# Altium footprint library Espressif.PcbLib: 20 footprints (part 1 of 2)
Each footprint in its own frame and in the unit in brackets; x right, y up, seen from the top. Pads: shape width x height; smd on the part's side, far side on the other; paste and mask are expansions set on the pad; w line width, h text height; cw(c..) or ccw(c..) is an arc to the next point about the centre after c.
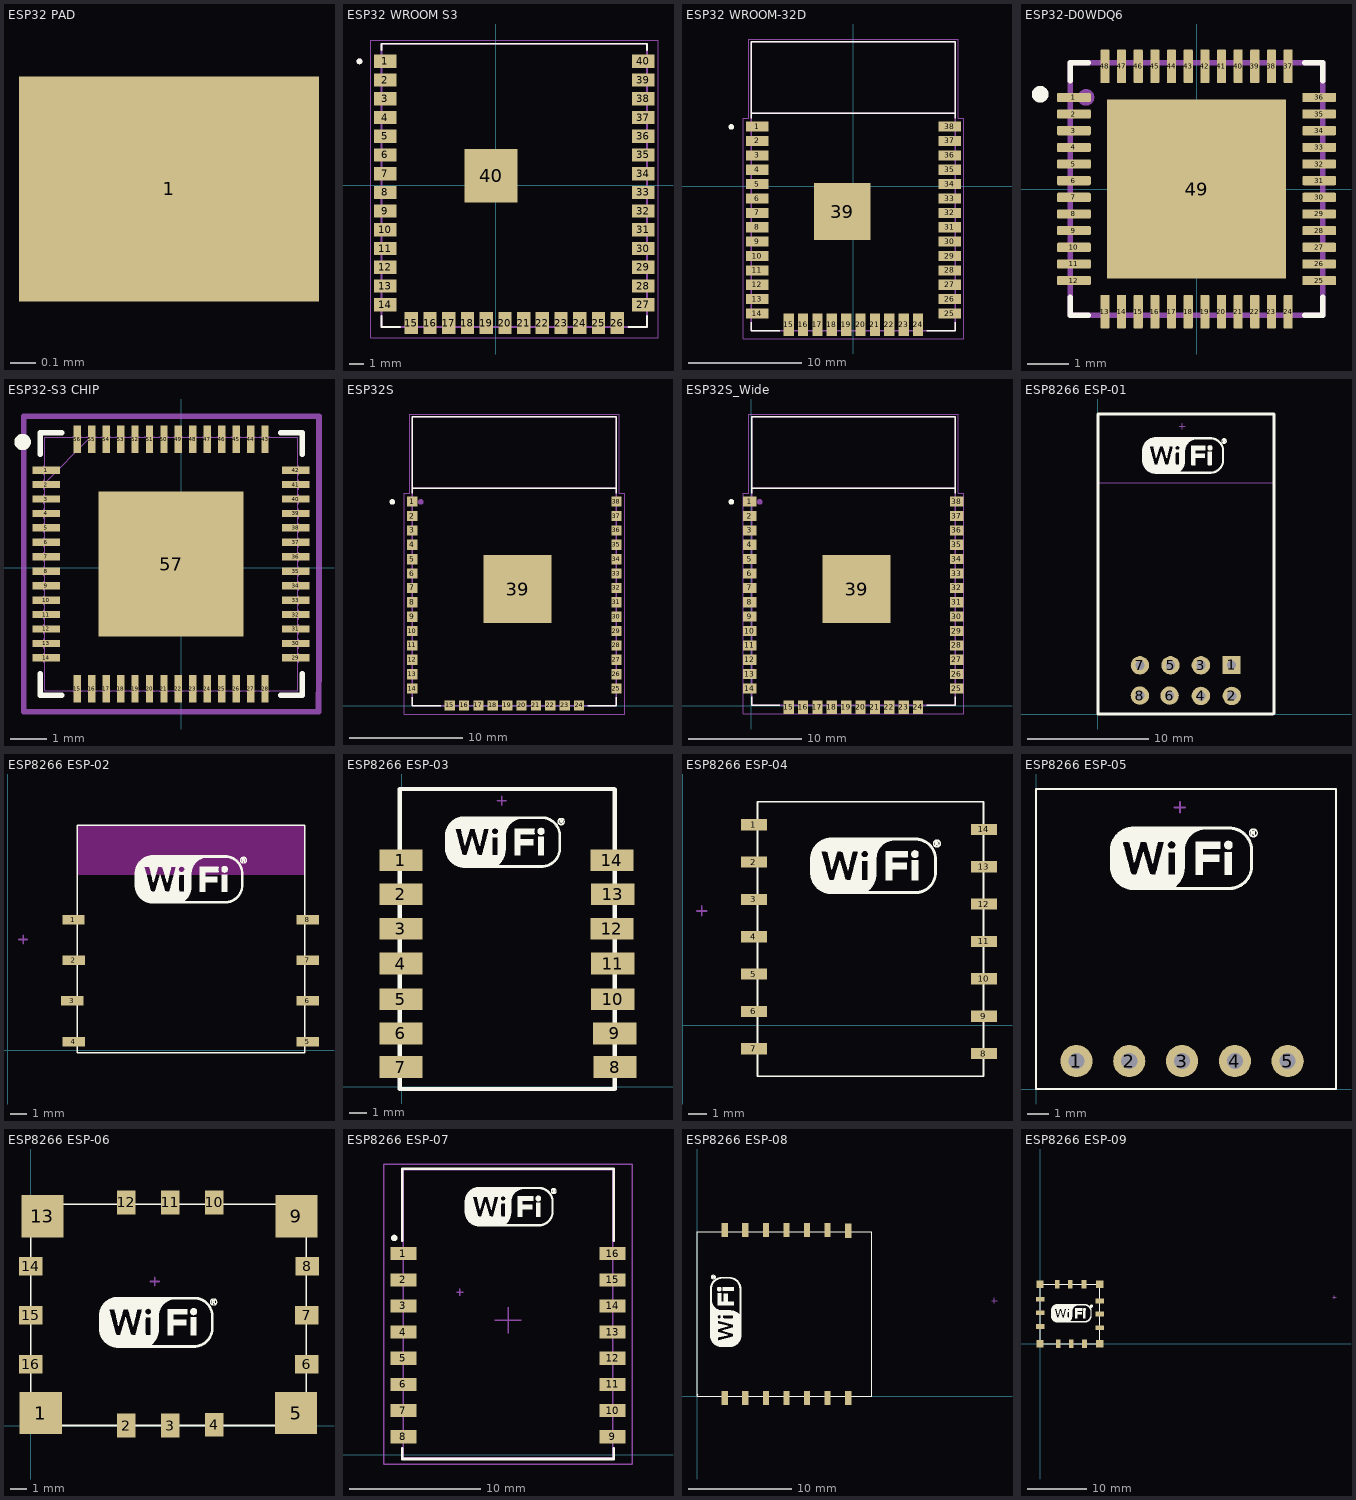
[diagram p0: the footprints below, top view; thin cyan lines are the x and y axes]

## ESP32 PAD [mm]
pads (1):
  rect 1.2x0.9 smd: 1(159.279,-33.319)

## ESP32 WROOM S3 [mm]
pads (41):
  rect 1.5x0.9 smd: 1(-7.507,8.395) 2(-7.507,7.125) 3(-7.507,5.855) 4(-7.507,4.585) 5(-7.507,3.315) 6(-7.507,2.045) 7(-7.507,0.775) 8(-7.507,-0.495) 9(-7.507,-1.765) 10(-7.507,-3.035) 11(-7.507,-4.305) 12(-7.507,-5.575) 13(-7.507,-6.845) 14(-7.507,-8.115) 27(9.993,-8.115) 28(9.993,-6.845) 29(9.993,-5.575) 30(9.993,-4.305) 31(9.993,-3.035) 32(9.993,-1.765) 33(9.993,-0.495) 34(9.993,0.775) 35(9.993,2.045) 36(9.993,3.315) 37(9.993,4.585) 38(9.993,5.855) 39(9.993,7.125) 40(9.993,8.395)
  rect 0.9x1.5 smd: 15(-5.742,-9.365) 16(-4.472,-9.365) 17(-3.202,-9.365) 18(-1.932,-9.365) 19(-0.662,-9.365) 20(0.608,-9.365) 21(1.878,-9.365) 22(3.148,-9.365) 23(4.418,-9.365) 24(5.688,-9.365) 25(6.958,-9.365) 26(8.228,-9.365)
  rect 3.6x3.6 smd: 40(-0.33,0.635)
Top Overlay:
  circle w0.2: c-9.257,8.395 r0.1
  lines w0.127: -7.757,-8.885 -7.757,-9.615 -6.512,-9.615 ; -7.757,9.165 -7.757,9.585 10.243,9.585 10.243,9.165 ; 8.998,-9.615 10.243,-9.615 10.243,-8.885
Mechanical 13:
  circle w0.2: c-9.257,8.395 r0.1
  lines w0.127: -7.757,-9.615 10.243,-9.615 10.243,9.585 -7.757,9.585 -7.757,-9.615
Mechanical 15:
  lines w0.05: -8.507,-10.365 -8.507,9.835 10.993,9.835 10.993,-10.365 -8.507,-10.365
3D body "ESP32-S3-WROOM-1U--3DModel-STEP-56544.STEP": height 3.35, standoff 0, extent -7.806,-9.549 10.194,9.651

## ESP32 WROOM-32D [mm]
pads (39):
  rect 2x0.9 smd: 1(-8.5,5.26) 2(-8.5,3.99) 3(-8.5,2.72) 4(-8.5,1.45) 5(-8.5,0.18) 6(-8.5,-1.09) 7(-8.5,-2.36) 8(-8.5,-3.63) 9(-8.5,-4.9) 10(-8.5,-6.17) 11(-8.5,-7.44) 12(-8.5,-8.71) 13(-8.5,-9.98) 14(-8.5,-11.25) 25(8.5,-11.25) 26(8.5,-9.98) 27(8.5,-8.71) 28(8.5,-7.44) 29(8.5,-6.17) 30(8.5,-4.9) 31(8.5,-3.63) 32(8.5,-2.36) 33(8.5,-1.09) 34(8.5,0.18) 35(8.5,1.45) 36(8.5,2.72) 37(8.5,3.99) 38(8.5,5.26)
  rect 0.9x2 smd: 15(-5.715,-12.25) 16(-4.445,-12.25) 17(-3.175,-12.25) 18(-1.905,-12.25) 19(-0.635,-12.25) 20(0.635,-12.25) 21(1.905,-12.25) 22(3.175,-12.25) 23(4.445,-12.25) 24(5.715,-12.25)
  rect 5x5 smd: 39(-1,-2.24)
Top Overlay:
  circle w0.3: c-10.777,5.238 r0.1
  lines w0.127: -9,-12 -9,-12.75 -6.5,-12.75 ; -9,6 -9,12.75 9,12.75 9,6 ; -8.96,6.45 8.96,6.45 ; 6.5,-12.75 9,-12.75 9,-12
Top Paste:
  region: -2.584,-0.659 0.581,-0.659 0.581,-3.825 -2.584,-3.825
Mechanical 4:
  circle w0.3: c-8.277,5.238 r0.1
  circle w0.3: c-8.277,5.238 r0.1
  lines w0.127: -9,-12.75 9,-12.75 ; -9,-12.75 -9,12.75 ; -9,-12.75 9,-12.75 ; -9,-12.75 -9,12.75 ; -9,12.75 9,12.75 ; -9,12.75 9,12.75 ; 9,-12.75 9,12.75 ; 9,-12.75 9,12.75 ; -8.96,6.45 8.96,6.45 -8.96,6.45
  text "ANTENNA" at -5.725,8.401 h1.88
  text "ANTENNA" at -5.725,8.401 h1.88
Mechanical 16:
  lines w0.05: -9.75,-13.5 9.75,-13.5 9.75,6 9.25,6 9.25,13 -9.25,13 -9.25,6 -9.75,6 -9.75,-13.5
3D body "ESP32 - WROOM - 32 v2-Altium.step": height 2.84, standoff -0.02, extent -9.008,-12.757 8.992,12.743

## ESP32-D0WDQ6 [mm]
pads (49):
  rrect25% 0.81x0.22 smd: 1(-2.945,2.2) 2(-2.945,1.8) 3(-2.945,1.4) 4(-2.945,1) 5(-2.945,0.6) 6(-2.945,0.2) 7(-2.945,-0.2) 8(-2.945,-0.6) 9(-2.945,-1) 10(-2.945,-1.4) 11(-2.945,-1.8) 12(-2.945,-2.2) 25(2.945,-2.2) 26(2.945,-1.8) 27(2.945,-1.4) 28(2.945,-1) 29(2.945,-0.6) 30(2.945,-0.2) 31(2.945,0.2) 32(2.945,0.6) 33(2.945,1) 34(2.945,1.4) 35(2.945,1.8) 36(2.945,2.2)
  rrect25% 0.22x0.81 smd: 13(-2.2,-2.945) 14(-1.8,-2.945) 15(-1.4,-2.945) 16(-1,-2.945) 17(-0.6,-2.945) 18(-0.2,-2.945) 19(0.2,-2.945) 20(0.6,-2.945) 21(1,-2.945) 22(1.4,-2.945) 23(1.8,-2.945) 24(2.2,-2.945) 37(2.2,2.945) 38(1.8,2.945) 39(1.4,2.945) 40(1,2.945) 41(0.6,2.945) 42(0.2,2.945) 43(-0.2,2.945) 44(-0.6,2.945) 45(-1,2.945) 46(-1.4,2.945) 47(-1.8,2.945) 48(-2.2,2.945)
  rect 4.3x4.3 smd paste-3: 49(0,0)
Top Overlay:
  circle w0.2: c-3.755,2.275 r0.1
  lines w0.127: -3.03,-2.6 -3.03,-3.03 -2.6,-3.03 ; -3.03,2.6 -3.03,3.03 -2.6,3.03 ; 2.6,-3.03 3.03,-3.03 3.03,-2.6 ; 2.6,3.03 3.03,3.03 3.03,2.6
Top Paste:
  region: 1.36,-1.362 -1.362,-1.362 -1.362,1.36 1.36,1.36
Mechanical 13:
  circle w0.2: c-2.655,2.2 r0.1
  lines w0.127: -3.03,-3.03 -3.03,3.03 3.03,3.03 3.03,-3.03 -3.03,-3.03
3D body "ESP32-D0WDQ6--3DModel-STEP-56544.STEP": height 0.85, standoff -0.05, extent -3,-3 3,3

## ESP32-S3 CHIP [mil]
pads (57):
  rect 30x8 smd paste+0 mask+0: 1(-147,106.36) 2(-147,90.61) 3(-147,74.87) 4(-147,59.12) 5(-147,43.37) 6(-147,27.62) 7(-147,11.87) 8(-147,-3.87) 9(-147,-19.62) 10(-147,-35.37) 11(-147,-51.12) 12(-147,-66.87) 13(-147,-82.61) 14(-147,-98.36) 29(125,-98.36) 30(125,-82.61) 31(125,-66.87) 32(125,-51.12) 33(125,-35.37) 34(125,-19.62) 35(125,-3.87) 36(125,11.87) 37(125,27.62) 38(125,43.37) 39(125,59.12) 40(125,74.87) 41(125,90.61) 42(125,106.36)
  rect 8x30 smd paste+0 mask+0: 15(-113.36,-132) 16(-97.61,-132) 17(-81.87,-132) 18(-66.12,-132) 19(-50.37,-132) 20(-34.62,-132) 21(-18.87,-132) 22(-3.13,-132) 23(12.62,-132) 24(28.37,-132) 25(44.12,-132) 26(59.87,-132) 27(75.61,-132) 28(91.36,-132) 43(91.36,140) 44(75.61,140) 45(59.87,140) 46(44.12,140) 47(28.37,140) 48(12.62,140) 49(-3.13,140) 50(-18.87,140) 51(-34.62,140) 52(-50.37,140) 53(-66.12,140) 54(-81.87,140) 55(-97.61,140) 56(-113.36,140)
  rect 158x158 smd paste-78.5 mask+0: 57(-11,4)
Top Overlay:
  circle w10: c-173,137 r3.94
  lines w6: -154,-115.46 -154,-139 -130.46,-139 ; -154,123.46 -154,147 -130.46,147 ; 108.46,-139 132,-139 132,-115.46 ; 108.46,147 132,147 132,123.46
Top Paste:
  region: -41.27,79.06 -86.06,79.06 -86.06,34.27 -41.27,34.27
  region: -41.27,26.4 -86.06,26.4 -86.06,-18.4 -41.27,-18.4
  region: -41.27,-26.27 -86.06,-26.27 -86.06,-71.06 -41.27,-71.06
  region: 11.4,79.06 -33.4,79.06 -33.4,34.27 11.4,34.27
  region: 11.4,26.4 -33.4,26.4 -33.4,-18.4 11.4,-18.4
  region: 11.4,-26.27 -33.4,-26.27 -33.4,-71.06 11.4,-71.06
  region: 64.06,79.06 19.27,79.06 19.27,34.27 64.06,34.27
  region: 64.06,26.4 19.27,26.4 19.27,-18.4 64.06,-18.4
  region: 64.06,-26.27 19.27,-26.27 19.27,-71.06 64.06,-71.06
Mechanical 1:
  lines w6: -172,-157 149.49,-157 150.2,-113.88 150.2,165 -156,165 -172,165 -172,-157
Mechanical 13:
  drawing of 229 lines, arcs and shapes, not listed
Mechanical 15:
  lines w6: -172,-157 -172,-112.36 -172,120.36 -172,146 -172,165 150,165 150,152 150,-112.36 150,-157 137,-157 -127.36,-157 -172,-157
3D body "QFN56_ESP32_7X7_EXP.step": height 35.12, standoff 0, extent -150.02,-135.02 128.02,143.02

## ESP32S [mm] "ESP32S-Module"
height 2.8
pads (39):
  rect 0.9x0.9 smd: 1(22.301,18.034) 2(22.301,16.764) 3(22.301,15.494) 4(22.301,14.224) 5(22.301,12.954) 6(22.301,11.684) 7(22.301,10.414) 8(22.301,9.144) 9(22.301,7.874) 10(22.301,6.604) 11(22.301,5.334) 12(22.301,4.064) 13(22.301,2.794) 14(22.301,1.524) 15(25.601,0.034) 16(26.871,0.034) 17(28.141,0.034) 18(29.411,0.034) 19(30.681,0.034) 20(31.951,0.034) 21(33.221,0.034) 22(34.491,0.034) 23(35.761,0.034) 24(37.031,0.034) 25(40.335,1.524) 26(40.335,2.794) 27(40.335,4.064) 28(40.335,5.334) 29(40.335,6.604) 30(40.335,7.874) 31(40.335,9.144) 32(40.335,10.414) 33(40.335,11.684) 34(40.335,12.954) 35(40.335,14.224) 36(40.335,15.494) 37(40.335,16.764) 38(40.335,18.034)
  rect 6x6 smd: 39(31.601,10.3)
Top Overlay:
  circle w0.3: c20.541,18.014 r0.1
  lines w0.127: 22.318,0.776 22.318,0.026 24.818,0.026 ; 22.318,18.776 22.318,25.526 40.318,25.526 40.318,18.776 ; 22.358,19.226 40.278,19.226 ; 37.818,0.026 40.318,0.026 40.318,0.776
Top Paste:
  region: 28.735,12.117 31.899,12.117 31.899,8.951 28.735,8.951
Mechanical 4:
  circle w0.3: c23.041,18.014 r0.1
  circle w0.3: c23.041,18.014 r0.1
  lines w0.127: 22.318,0.026 22.318,25.526 ; 22.318,0.026 22.318,25.526 ; 22.318,0.026 40.318,0.026 ; 22.318,0.026 40.318,0.026 ; 22.318,25.526 40.318,25.526 ; 22.318,25.526 40.318,25.526 ; 40.318,0.026 40.318,25.526 ; 40.318,0.026 40.318,25.526 ; 22.358,19.226 40.278,19.226 22.358,19.226
  text "ANTENNA" at 25.593,21.177 h1.88
  text "ANTENNA" at 25.593,21.177 h1.88
Mechanical 16:
  lines w0.05: 21.568,-0.724 21.568,18.776 22.068,18.776 22.068,25.776 40.568,25.776 40.568,18.776 41.068,18.776 41.068,-0.724 21.568,-0.724
3D body "ESP32 - WROOM - 32 v2-Altium.step": height 2.84, standoff -0.02, extent 22.311,0.019 40.311,25.519

## ESP32S_Wide [mm] "Esp32S Module wide for hand soldering"
pads (39):
  rect 1.2x0.9 smd: 1(-0.127,18.034) 2(-0.127,16.764) 3(-0.127,15.494) 4(-0.127,14.224) 5(-0.127,12.954) 6(-0.127,11.684) 7(-0.127,10.414) 8(-0.127,9.144) 9(-0.127,7.874) 10(-0.127,6.604) 11(-0.127,5.334) 12(-0.127,4.064) 13(-0.127,2.794) 14(-0.127,1.524) 25(18.161,1.524) 26(18.161,2.794) 27(18.161,4.064) 28(18.161,5.334) 29(18.161,6.604) 30(18.161,7.874) 31(18.161,9.144) 32(18.161,10.414) 33(18.161,11.684) 34(18.161,12.954) 35(18.161,14.224) 36(18.161,15.494) 37(18.161,16.764) 38(18.161,18.034)
  rect 0.9x1.2 smd: 15(3.302,-0.127) 16(4.57,-0.127) 17(5.84,-0.127) 18(7.11,-0.127) 19(8.38,-0.127) 20(9.65,-0.127) 21(10.92,-0.127) 22(12.19,-0.127) 23(13.46,-0.127) 24(14.73,-0.127)
  rect 6x6 smd: 39(9.3,10.3)
Top Overlay:
  circle w0.3: c-1.76,18.014 r0.1
  lines w0.127: 0.017,0.776 0.017,0.026 2.517,0.026 ; 0.017,18.776 0.017,25.526 18.017,25.526 18.017,18.776 ; 0.057,19.226 17.977,19.226 ; 15.517,0.026 18.017,0.026 18.017,0.776
Top Paste:
  region: 6.433,12.117 9.598,12.117 9.598,8.951 6.433,8.951
Mechanical 4:
  circle w0.3: c0.74,18.014 r0.1
  circle w0.3: c0.74,18.014 r0.1
  lines w0.127: 0.017,0.026 0.017,25.526 ; 0.017,0.026 0.017,25.526 ; 0.017,0.026 18.017,0.026 ; 0.017,0.026 18.017,0.026 ; 0.017,25.526 18.017,25.526 ; 0.017,25.526 18.017,25.526 ; 18.017,0.026 18.017,25.526 ; 18.017,0.026 18.017,25.526 ; 0.057,19.226 17.977,19.226 0.057,19.226
  text "ANTENNA" at 3.292,21.177 h1.88
  text "ANTENNA" at 3.292,21.177 h1.88
Mechanical 16:
  lines w0.05: -0.733,-0.724 -0.733,18.776 -0.233,18.776 -0.233,25.776 18.267,25.776 18.267,18.776 18.767,18.776 18.767,-0.724 -0.733,-0.724
3D body "ESP32 - WROOM - 32 v2-Altium.step": height 2.84, standoff -0.02, extent 0.009,0.019 18.009,25.519

## ESP8266 ESP-01 [mil] "ESP8266 ESP-01"
pads (8):
  rect 60x60 hole 30: 1(436,161)
  round 60 hole 30: 2(437,60) 3(336,160) 4(336,60) 5(237,160) 6(234,61) 7(137,160) 8(137,61)
Top Overlay:
  drawing of 1265 lines, arcs and shapes, not listed
  text ".Designator" at -15,-37 h39.37
Mechanical 13:
  lines w2: 0.04,755.97 575,755.97
  text "CUTOUT POLYGON" at 10.04,938.59 h10
  text "ANTENNA AREA" at 10.04,958.59 h10
Mechanical 15:
  lines w3.94: 265,939.92 285,939.92 ; 275,929.92 275,949.92
3D body "User Library-Wi07C.STEP": height 231.4, standoff -228.35, extent 1.13,1.81 572,978.19

## ESP8266 ESP-02 [mm] "ESP8266 ESP-02"
pads (8):
  rect 1.4x0.6 smd: 1(4.115,8.153) 2(4.14,5.613) 3(4.039,3.073) 4(4.14,0.533) 5(18.745,0.533) 6(18.745,3.073) 7(18.745,5.613) 8(18.745,8.153)
Top Layer keep-out:
  region: 18.543,14.046 18.517,14.019 18.517,10.947 4.369,10.947 4.343,10.973 4.343,14.046
Top Overlay:
  drawing of 1264 lines, arcs and shapes, not listed
  text ".Designator" at 3.378,14.046 h1
Mechanical 15:
  lines w0.1: 0.713,6.909 1.221,6.909 ; 0.967,6.655 0.967,7.163
3D body: height 1, standoff 0.5, extent 8.979,0.952 11.239,3.416
3D body: height 1, standoff 0.5, extent 7.798,4.902 12.294,9.22
3D body: height 0.5, standoff 0, extent 4.343,-0.152 18.542,14.046

## ESP8266 ESP-03 [mil] "ESP8266 ESP-03"
pads (14):
  rect 100x50 smd: 1(-2,522) 2(-2,443.27) 3(-2,364) 4(-2,284) 5(-2,202) 6(-2,123) 7(-2,45.57) 8(491,45.57) 9(490,123) 10(486,202) 11(486,284) 12(484,364) 13(486,443.27) 14(484,522)
Top Overlay:
  drawing of 1265 lines, arcs and shapes, not listed
  text ".Designator" at -6,-48 h39.37
Mechanical 15:
  lines w3.94: 220,658.92 240,658.92 ; 230,648.92 230,668.92
3D body "User Library-ESP-03.STEP": height 134.34, standoff -1.09, extent -0.97,1 483.28,682.1

## ESP8266 ESP-04 [mm] "ESP8266 ESP-04"
pads (14):
  rect 1.4x0.6 smd: 1(3.81,10.735) 2(3.81,8.735) 3(3.81,6.735) 4(3.81,4.735) 5(3.81,2.735) 6(3.81,0.735) 7(3.81,-1.265) 8(16.129,-1.519) 9(16.129,0.481) 10(16.129,2.481) 11(16.129,4.481) 12(16.129,6.481) 13(16.129,8.481) 14(16.129,10.481)
Top Overlay:
  drawing of 1264 lines, arcs and shapes, not listed
  text ".Designator" at 2.057,12.04 h1
Mechanical 15:
  lines w0.1: 0.764,6.121 1.272,6.121 ; 1.018,5.867 1.018,6.375
3D body: height 1, standoff 0.5, extent 5.994,0.229 8.255,2.692
3D body: height 1, standoff 0.5, extent 5.969,3.962 10.465,8.28
3D body: height 0.5, standoff 0, extent 4.013,-2.718 16.104,11.963

## ESP8266 ESP-05 [mil] "ESP8266 ESP-05"
pads (5):
  round 60 hole 30: 1(75.3,52) 2(173.72,52) 3(272.15,52) 4(370.57,52) 5(469,52)
Top Overlay:
  drawing of 1264 lines, arcs and shapes, not listed
  text ".Designator" at 1,-40 h39.37
Mechanical 15:
  lines w3.94: 258,524.92 278,524.92 ; 268,514.92 268,534.92
3D body: height 19.68, standoff 0, extent 0,1 559,559
3D body: height 39.37, standoff 19.68, extent 105,137 275,314
3D body: height 39.37, standoff 19.68, extent 325,138 422,227

## ESP8266 ESP-06 [mm] "ESP8266 ESP-06"
pads (16):
  rect 2.5x2.5 smd: 1(0.584,0.737) 5(15.697,0.737) 9(15.723,12.395) 13(0.686,12.395)
  rect 1.1x1.4 smd: 2(5.648,0) 3(8.248,0) 4(10.848,0.051) 10(10.848,13.208) 11(8.248,13.208) 12(5.648,13.208)
  rect 1.4x1.1 smd: 6(16.332,3.642) 7(16.332,6.542) 8(16.358,9.442) 14(0,9.442) 15(0,6.542) 16(0,3.642)
Top Overlay:
  drawing of 1264 lines, arcs and shapes, not listed
  text ".Designator" at -0.686,-1.651 h1
Mechanical 15:
  lines w0.1: 7.087,8.532 7.595,8.532 ; 7.341,8.278 7.341,8.786
3D body: height 1, standoff 0.5, extent 9.322,3.241 11.786,5.501
3D body: height 1, standoff 0.5, extent 3.734,3.215 8.052,7.711
3D body: height 0.5, standoff 0, extent 0,0 16.281,13.081

## ESP8266 ESP-07 [mm] "ESP8266 ESP-01"
pads (17):
  rect 2x1 smd: 1(5.437,15.371) 2(5.437,13.371) 3(5.437,11.371) 4(5.437,9.371) 5(5.437,7.371) 6(5.437,5.371) 7(5.437,3.371) 8(5.437,1.371) 9(21.437,1.371) 10(21.437,3.371) 11(21.437,5.371) 12(21.437,7.371) 13(21.437,9.371) 14(21.437,11.371) 15(21.437,13.371) 16(21.437,15.371)
  round 0.5 on Top Overlay: ""(4.737,16.571)
Top Overlay:
  drawing of 1267 lines, arcs and shapes, not listed
  text ".Designator" at 3.353,21.387 h1
Mechanical 1:
  lines w0.1: 5.437,-0.229 21.437,-0.229 21.437,21.771 5.437,21.771 5.437,-0.229
Mechanical 15:
  lines w0.1: 9.5,12.419 10.008,12.419 ; 9.754,12.165 9.754,12.673 ; 12.437,10.287 14.437,10.287 ; 13.437,9.287 13.437,11.287 ; 3.937,-0.713 3.937,22.225 22.937,22.225 22.937,-0.713 3.937,-0.713
3D body "User Library-ESP07-1.STEP": height 3.5, standoff -0.01, extent 5.437,-0.229 21.437,21.771

## ESP8266 ESP-08 [mm] "ESP8266 ESP-08"
pads (14):
  rect 0.6x1.4 smd: 1(2.695,-0.178) 2(4.695,-0.178) 3(6.695,-0.178) 4(8.695,-0.178) 5(10.695,-0.178) 6(12.695,-0.178) 7(14.695,-0.178) 8(14.695,16.078) 9(12.695,16.154) 10(10.695,16.154) 11(8.695,16.154) 12(6.695,16.154) 13(4.695,16.154) 14(2.695,16.154)
Top Overlay:
  drawing of 1265 lines, arcs and shapes, not listed
  text ".Designator" at -0.229,-1.499 h1
Mechanical 15:
  lines w0.1: 28.651,9.294 29.159,9.294 ; 28.905,9.04 28.905,9.548
3D body: height 0.5, standoff 0, extent 0,0 17.018,16.002
3D body: height 1, standoff 0.5, extent 4.75,2.565 9.068,7.061
3D body: height 1, standoff 0.5, extent 10.338,2.591 12.802,4.851

## ESP8266 ESP-09 [mm] "ESP8266 ESP-09"
pads (16):
  rect 1.2x1.2 smd: 1(0,0) 5(10,0) 9(10,10) 13(0,10)
  rect 0.8x1.4 smd: 2(3.023,0) 3(5.232,0) 4(7.442,0) 10(7.366,10) 11(5.055,10) 12(2.87,10)
  rect 1.4x0.8 smd: 6(10,2.692) 7(10,4.978) 8(10,7.188) 14(0,7.493) 15(0,5.194) 16(0,2.896)
Top Overlay:
  drawing of 1264 lines, arcs and shapes, not listed
  text ".Designator" at -0.635,-1.651 h1
Mechanical 15:
  lines w0.1: 49.2,7.796 49.708,7.796 ; 49.454,7.542 49.454,8.05
3D body: height 1, standoff 0.5, extent 2.565,2.769 7.061,7.087
3D body: height 0.5, standoff 0, extent 0,0 10.008,10.008